# Altium footprint library AD常用3D封装.PCBLIB: 343 footprints (part 21 of 22)
Each footprint in its own frame and in the unit in brackets; x right, y up, seen from the top. Pads: shape width x height; smd on the part's side, far side on the other; paste and mask are expansions set on the pad; w line width, h text height; cw(c..) or ccw(c..) is an arc to the next point about the centre after c.
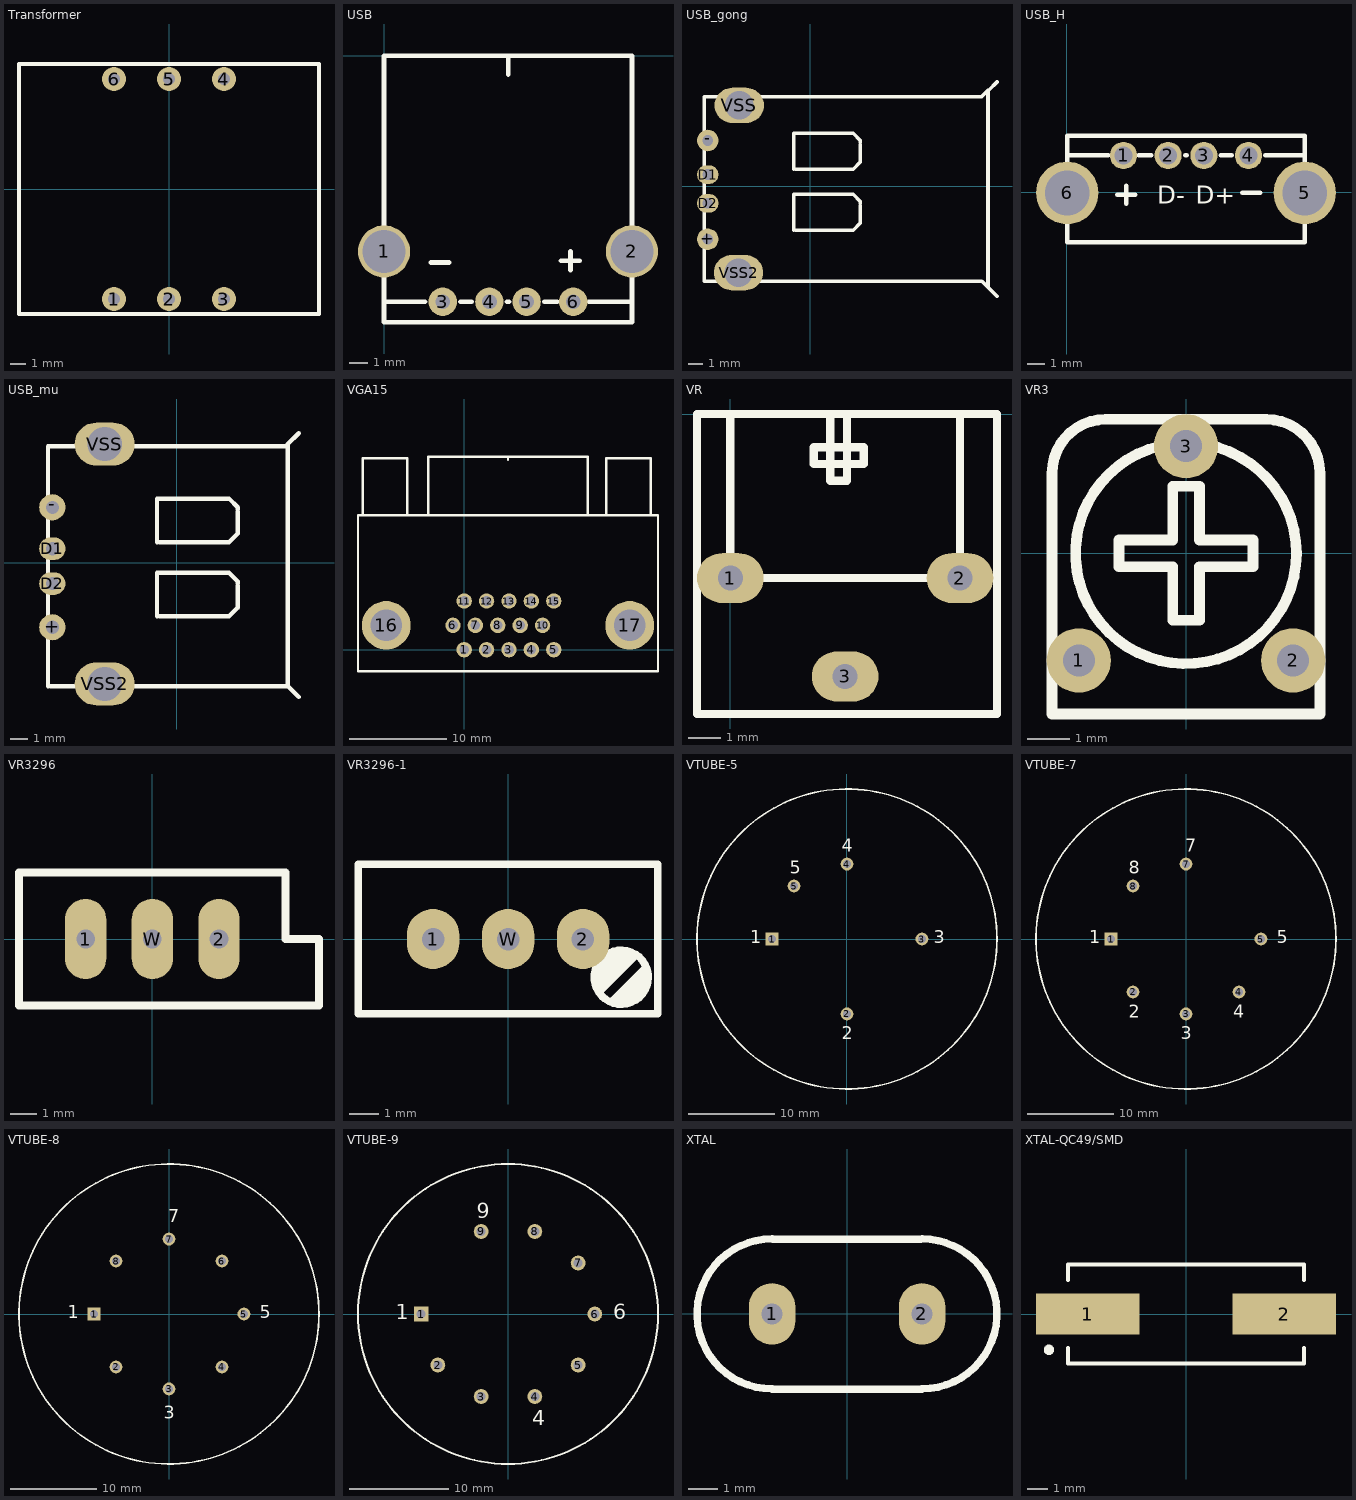
[diagram p20: the footprints below, top view; thin cyan lines are the x and y axes]

## Transformer [mil]
pads (6):
  round 60 hole 30: 1(-137.5,-275) 2(0,-275) 3(137.5,-275) 4(137.5,275) 5(0,275) 6(-137.5,275)
TopOverlay:
  lines w10: -375,-312.5 -375,312.5 375,312.5 375,-312.5 -375,-312.5
3D body: height 590.55, standoff -39.37, extent -372.01,-314.95 376.02,314.97

## USB [mm]
pads (6):
  round 2.8 hole 2.3: 1(0,-10.5) 2(13.3,-10.5)
  round 1.524 hole 0.8: 3(3.15,-13.2) 4(5.65,-13.2) 5(7.65,-13.2) 6(10.15,-13.2)
TopOverlay:
  lines w0.254: 0,-13.2 2.2,-13.2 ; 2.5,-11.1 3.5,-11.1 ; 4.1,-13.2 4.7,-13.2 ; 6.6,-13.2 6.7,-13.2 ; 6.66,-1 6.66,0 ; 8.6,-13.2 9.3,-13.2 ; 9.5,-11 10.5,-11 ; 10,-11.5 10,-10.5 ; 11,-13.2 13.3,-13.2 ; 0,-14.3 13.3,-14.3 13.3,0 0,0 0,-14.3
3D body: height 7.55, standoff -3.3, extent -1.245,-14.3 14.555,-0.14

## USB_gong [mil]
pads (6):
  round 60 hole 30: +(-285.63,-147.91) -(-285.63,127.09)
  oval 60x52.13 hole 30: D1(-285.63,32.09) D2(-285.63,-47.91)
  oval 137.79x98.42 hole 78.74: VSS(-198,225) VSS2(-200,-241)
TopOverlay:
  lines w10: -45.63,-122.91 -45.63,-22.91 119.37,-22.91 139.37,-42.91 139.37,-47.91 ; -45.63,47.09 -45.63,147.09 119.37,147.09 139.37,127.09 139.37,122.09 ; -40.63,-122.91 119.37,-122.91 139.37,-102.91 139.37,-52.91 ; -40.63,47.09 119.37,47.09 139.37,67.09 139.37,117.09 ; 495,-282 520,-307 ; 496.09,267.09 495,267.09 ; 520,290 497.09,267.09 495,267.09 ; 495,267.09 495,-281.91 478.09,-265 -295.63,-265 -295.63,249 476.91,249 495,267.09
3D body: height 177.95, standoff -46.46, extent -291.47,-255.06 497.11,237.07

## USB_H [mm] "立式USB插座"
height 14
pads (6):
  round 1.524 hole 1: 1(3.185,2.065) 2(5.685,2.065) 3(7.685,2.065) 4(10.185,2.065)
  round 3.5 hole 2.5: 5(13.335,-0.035) 6(0.035,-0.035)
TopOverlay:
  lines w0.254: 0.035,2.065 2.335,2.065 ; 2.835,-0.135 3.835,-0.135 ; 3.335,-0.635 3.335,0.365 ; 4.035,2.065 4.735,2.065 ; 6.635,2.065 6.735,2.065 ; 8.635,2.065 9.235,2.065 ; 9.835,-0.035 10.835,-0.035 ; 11.135,2.065 13.335,2.065 ; 0.035,-2.794 13.335,-2.794 13.335,3.165 0.035,3.165 0.035,-2.794
  text "D-" at 5.08,-0.635 h1
  text "D+" at 7.239,-0.635 h1

## USB_mu [mm]
pads (6):
  round 1.524 hole 0.762: +(-7.255,-3.757) -(-7.255,3.228)
  oval 1.524x1.324 hole 0.762: D1(-7.255,0.815) D2(-7.255,-1.217)
  oval 3.5x2.5 hole 2: VSS(-4.207,6.911) VSS2(-4.207,-7.059)
TopOverlay:
  lines w0.254: -7.509,-7.186 -7.509,6.784 6.461,6.784 ; -7.382,-7.186 6.461,-7.186 ; -1.159,-3.122 -1.159,-0.582 3.032,-0.582 3.54,-1.09 3.54,-1.217 ; -1.159,1.196 -1.159,3.736 3.032,3.736 3.54,3.228 3.54,3.101 ; -1.032,-3.122 3.032,-3.122 3.54,-2.614 3.54,-1.344 ; -1.032,1.196 3.032,1.196 3.54,1.704 3.54,2.974 ; 7.096,-7.821 6.461,-7.186 ; 7.096,7.546 6.461,6.911 6.461,6.784 ; 6.461,-7.186 6.461,6.784
3D body: height 7.65, standoff -3.27, extent -8.117,-8.128 5.983,7.671

## VGA15 [mm]
pads (17):
  round 1.58 hole 1: 1(0,0) 2(2.3,0) 3(4.6,0) 4(6.9,0) 5(9.2,0) 6(-1.15,2.5) 7(1.15,2.5) 8(3.45,2.5) 9(5.75,2.5) 10(8.05,2.5) 11(0,5) 12(2.3,5) 13(4.6,5) 14(6.9,5) 15(9.2,5)
  round 5 hole 3.25: 16(-8,2.5) 17(17,2.5)
TopOverlay:
  lines w0.254: -10.9,-2.2 -10.9,13.8 19.9,13.8 19.9,-2.2 -10.89,-2.2 -10.9,-2.19 ; -10.4,13.8 -10.4,19.67 -5.83,19.67 -5.83,13.82 ; -3.7,13.8 -3.7,19.8 12.7,19.8 12.7,13.8 ; 4.5,19.5 4.5,19.8 ; 14.6,13.8 14.6,19.68 19.18,19.68 19.18,13.84
3D body: height 12.77, standoff -3.27, extent -11.055,-0.875 19.755,20.225

## VR [mil]
pads (3):
  oval 80x60 hole 30: 1(0,-196.85) 2(275.59,-196.85) 3(137.8,-314.96)
TopOverlay:
  lines w10: 120,0 120,-80 140,-80 140,0 ; 0,0 -40,0 -40,-360 320,-360 320,-300 320,0 275.59,0 ; 0,0 0,-196.85 275.59,-196.85 275.59,0 ; 0,0 275.59,0 ; 100,-60 100,-40 160,-40 160,-60 100,-60

## VR3 [mil]
pads (3):
  round 60 hole 30: 1(-100,-100) 2(100,-100) 3(0,100)
TopOverlay:
  circle w10: c0,0 r103.08
  lines w10: -125,-150 125,-150 125,75 ccw(c75,75) 75,125 -75,125 ccw(c-75,75) -125,75 -125,-150 ; -62.5,-12.5 -12.5,-12.5 -12.5,-62.5 12.5,-62.5 12.5,-12.5 62.5,-12.5 62.5,12.5 12.5,12.5 12.5,62.5 -12.5,62.5 -12.5,12.5 -62.5,12.5 -62.5,-12.5
3D body: height 295.28, standoff -78.74, extent -125.97,-149.59 125.99,126

## VR3296 [mil]
pads (3):
  oval 62x120 hole 28: 1(-100,0) 2(100,0) W(0,0)
TopOverlay:
  lines w12: -200,-100 -200,100 200,100 200,0 250,0 250,-100 -200,-100
3D body: height 470.78, standoff -218.19, extent -182.1,-94.98 180.1,94

## VR3296-1 [mil]
pads (3):
  oval 70x80 hole 30: 1(-100,0) 2(100,0) W(0,0)
TopOverlay:
  circle w10: c151,-51 r36.06
  lines w10: 157.76,-74.24 164.24,-74.24 171,-81 ; 171,-21 151,-41 121,-71 121,-61 161,-21 141,-21 ; 172.88,-79.12 171,-81 ; 181,-41 141,-81 151,-81 ; 131,-31 141,-31 ; 131,-31 141,-21 ; 131,-31 121,-41 121,-51 141,-31 ; 141,-31 151,-31 141,-21 ; 141,-31 141,-21 ; 151,-81 166.82,-65.18 172.88,-65.18 187.06,-51 187.06,-47.06 172.88,-61.23 170.77,-61.23 171,-61.47 171,-81 ; 151,-81 171,-81 ; -200,-100 -200,100 200,100 200,-100 0,-100 -200,-100
3D body: height 470.78, standoff -218.19, extent -180.58,-95 181.63,93.98

## VTUBE-5 [mm] "Thyratron; 5 Leads"
pads (5):
  rect 1.5x1.5 hole 0.9: 1(-8.725,0)
  round 1.5 hole 0.9: 2(0,-8.725) 3(8.725,0) 4(0,8.725) 5(-6.17,6.17)
TopOverlay:
  circle w0.2: c0,0 r17.462
  text "3" at 10.071,-0.508 h1.5
  text "5" at -6.693,7.62 h1.5
  text "4" at -0.597,10.16 h1.5
  text "2" at -0.597,-11.684 h1.5
  text "1" at -11.265,-0.508 h1.5

## VTUBE-7 [mm] "Beam Power Pentode; 7 Leads"
height 108
pads (7):
  rect 1.5x1.5 hole 0.9: 1(-8.725,0)
  round 1.5 hole 0.9: 2(-6.17,-6.17) 3(0,-8.725) 4(6.17,-6.17) 5(8.725,0) 7(0,8.725) 8(-6.17,6.17)
TopOverlay:
  circle w0.2: c0,0 r17.462
  text "8" at -6.693,7.62 h1.5
  text "7" at -0.089,10.16 h1.5
  text "5" at 10.579,-0.508 h1.5
  text "4" at 5.499,-9.144 h1.5
  text "3" at -0.597,-11.684 h1.5
  text "2" at -6.693,-9.144 h1.5
  text "1" at -11.265,-0.508 h1.5

## VTUBE-8 [mm] "Medium Mu Dual Triode; 8 Leads"
height 108
pads (8):
  rect 1.5x1.5 hole 0.9: 1(-8.725,0)
  round 1.5 hole 0.9: 2(-6.17,-6.17) 3(0,-8.725) 4(6.17,-6.17) 5(8.725,0) 6(6.17,6.17) 7(0,8.725) 8(-6.17,6.17)
TopOverlay:
  circle w0.2: c0,0 r17.462
  text "1" at -11.773,-0.508 h1.5
  text "3" at -0.597,-12.192 h1.5
  text "5" at 10.579,-0.508 h1.5
  text "7" at -0.089,10.668 h1.5

## VTUBE-9 [mm] "Medium Mu Dual Triode; 9 Leads"
height 55.6
pads (9):
  rect 1.5x1.5 hole 0.9: 1(-8.725,0)
  round 1.5 hole 0.9: 2(-7.059,-5.128) 3(-2.696,-8.298) 4(2.696,-8.298) 5(7.059,-5.128) 6(8.725,0) 7(7.059,5.128) 8(2.696,8.298) 9(-2.696,8.298)
TopOverlay:
  circle w0.2: c0,0 r15.081
  text "4" at 2.451,-11.176 h1.5
  text "6" at 10.579,-0.508 h1.5
  text "9" at -3.137,9.652 h1.5
  text "1" at -11.265,-0.508 h1.5

## XTAL [mil]
pads (2):
  oval 62x82 hole 28: 1(-100,0) 2(100,0)
TopOverlay:
  lines w10: -100,-100.39 99.8,-100.39 ; -100,-100 cw(c-100,0) -100,100 ; -99.02,99.41 98.62,99.37 ; 100,-100 ccw(c100,0) 100,100
3D body: height 137.8, standoff -157.48, extent -221.85,-91.54 225,91.54

## XTAL-QC49/SMD [mm]
pads (2):
  rect 5x2 smd: 1(-4.75,0) 2(4.75,0)
TopOverlay:
  circle w0.25: c-6.625,-1.73 r0.125
  lines w0.2: -5.7,-1.65 -5.7,-2.4 5.7,-2.4 5.7,-1.65 ; -5.7,1.65 -5.7,2.4 5.7,2.4 5.7,1.65
3D body: height 4, standoff 0, extent -6.7,-2.462 6.7,2.438